# Altium integrated library Connectors.IntLib: 512 symbols (part 1 of 2) (continued)
## B10B-XH-A
designator CON?  (value not drawn)
3 A 250 V 2.5 mm; Value: B10B-XH-A; Pricing Аlternative: 0.029; Note: Connector; Temp.Characteristic: -40C to +85C; ComponentLink1URL: http://www.jst-mfg.com; ComponentLink2URL: http://www.jst-mfg.com/product/images/pdf.gif; Dealer Digi-Key: https://detail.1688.com/offer/38233239228.html; Package / Case: 2.5 mm; PartNumber Digi-Key: B10B-XH-A; Pricing Digi-Key: 0.1; Publisher: Catcatcat Electronics; Voltage: 3 A 250 V 2.5 mm; Website developer: http://catcatcat.d-lan.dp.ua/; Assembly type: Manual Part
footprint B10B-XH-A
pins: 1, 2, 3, 4, 5, 6, 7, 8, 9, 10

## CON4M
designator CON?  (value not drawn)
Note: Connector; Temp.Characteristic: -40C to +85C; Value: *; Publisher: Catcatcat Electronics; Website developer: http://catcatcat.d-lan.dp.ua/; Assembly type: Manual Part
footprint SOED4
pins: 1, 2, 3, 4

## CON6F
designator CON?  (value not drawn)
Note: Connector; Temp.Characteristic: -40C to +85C; Value: *; Publisher: Catcatcat Electronics; Website developer: http://catcatcat.d-lan.dp.ua/; Assembly type: Manual Part
footprint SOED6
pins: 1, 2, 3, 4, 5, 6

## CON6M
designator CON?  (value not drawn)
Note: Connector; Temp.Characteristic: -40C to +85C; Value: *; Publisher: Catcatcat Electronics; Website developer: http://catcatcat.d-lan.dp.ua/; Assembly type: Manual Part
footprint SOED6
pins: 1, 2, 3, 4, 5, 6

## CON8F
designator CON?  (value not drawn)
Note: Connector; Temp.Characteristic: -40C to +85C; Value: *; Publisher: Catcatcat Electronics; Website developer: http://catcatcat.d-lan.dp.ua/; Assembly type: Manual Part
footprint SOED8
pins: 1, 2, 3, 4, 5, 6, 7, 8

## CON8M
designator CON?  (value not drawn)
Note: Connector; Temp.Characteristic: -40C to +85C; Value: *; Publisher: Catcatcat Electronics; Website developer: http://catcatcat.d-lan.dp.ua/; Assembly type: Manual Part
footprint SOED8
pins: 1, 2, 3, 4, 5, 6, 7, 8

## CON10M
designator CON?  (value not drawn)
Note: Connector; Temp.Characteristic: -40C to +85C; Value: *; Publisher: Catcatcat Electronics; Website developer: http://catcatcat.d-lan.dp.ua/; Assembly type: Manual Part
footprint SOED10
pins: 1, 2, 3, 4, 5, 6, 7, 8, 9, 10

## CON18F
designator CON?  (value not drawn)
Note: Connector; Temp.Characteristic: -40C to +85C; Value: *; Publisher: Catcatcat Electronics; Website developer: http://catcatcat.d-lan.dp.ua/; Assembly type: Manual Part
footprint SOED18
pins: 1, 2, 3, 4, 5, 6, 7, 8, 9, 10, 11, 12, 13, 14, 15, 16, 17, 18

## CON18M
designator CON?  (value not drawn)
Note: Connector; Temp.Characteristic: -40C to +85C; Value: *; Publisher: Catcatcat Electronics; Website developer: http://catcatcat.d-lan.dp.ua/; Assembly type: Manual Part
footprint SOED18
pins: 1, 2, 3, 4, 5, 6, 7, 8, 9, 10, 11, 12, 13, 14, 15, 16, 17, 18

## CON20M
designator CON?  (value not drawn)
Note: Connector; Temp.Characteristic: -40C to +85C; Value: *; Publisher: Catcatcat Electronics; Website developer: http://catcatcat.d-lan.dp.ua/; Assembly type: Manual Part
footprint SOED20
pins: 1, 2, 3, 4, 5, 6, 7, 8, 9, 10, 11, 12, 13, 14, 15, 16, 17, 18, 19, 20

## CON-2P-AK-F
designator CA?
Note: Connector; Temp.Characteristic: -40C to +85C; Value: *; Publisher: Catcatcat Electronics; Website developer: http://catcatcat.d-lan.dp.ua/; Assembly type: Manual Part
footprint CON-2P-AK
pins: 1, 2

## CON-2P-AK-M
designator CA?
Note: Connector; Temp.Characteristic: -40C to +85C; Value: *; Publisher: Catcatcat Electronics; Website developer: http://catcatcat.d-lan.dp.ua/; Assembly type: Manual Part
footprint CON-2P-AK
pins: 1, 2

## CON-4PSM
designator CON?
Note: Connector; Temp.Characteristic: -40C to +85C; Value: *; Publisher: Catcatcat Electronics; Website developer: http://catcatcat.d-lan.dp.ua/; Assembly type: Manual Part
footprint CON-4PS
pins: 1, 2, 3, 4

## CON_9P_F
designator CON?
Note: Connector; Temp.Characteristic: -40C to +85C; Value: *; Publisher: Catcatcat Electronics; Website developer: http://catcatcat.d-lan.dp.ua/; Assembly type: Manual Part
footprint DB9RF
pins: 1, 2, 3, 4, 5, 6, 7, 8, 9

## CON_9P_M
designator CON?  (value not drawn)
Note: Connector; Temp.Characteristic: -40C to +85C; Value: *; Publisher: Catcatcat Electronics; Website developer: http://catcatcat.d-lan.dp.ua/; Assembly type: Manual Part
footprint DB9RF
pins: 1, 2, 3, 4, 5, 6, 7, 8, 9

## CON_9P_MP
designator CON?
Note: Connector; Temp.Characteristic: -40C to +85C; Value: *; Publisher: Catcatcat Electronics; Website developer: http://catcatcat.d-lan.dp.ua/; Assembly type: Manual Part
footprint DB9F
pins: 1, 2, 3, 4, 5, 6, 7, 8, 9

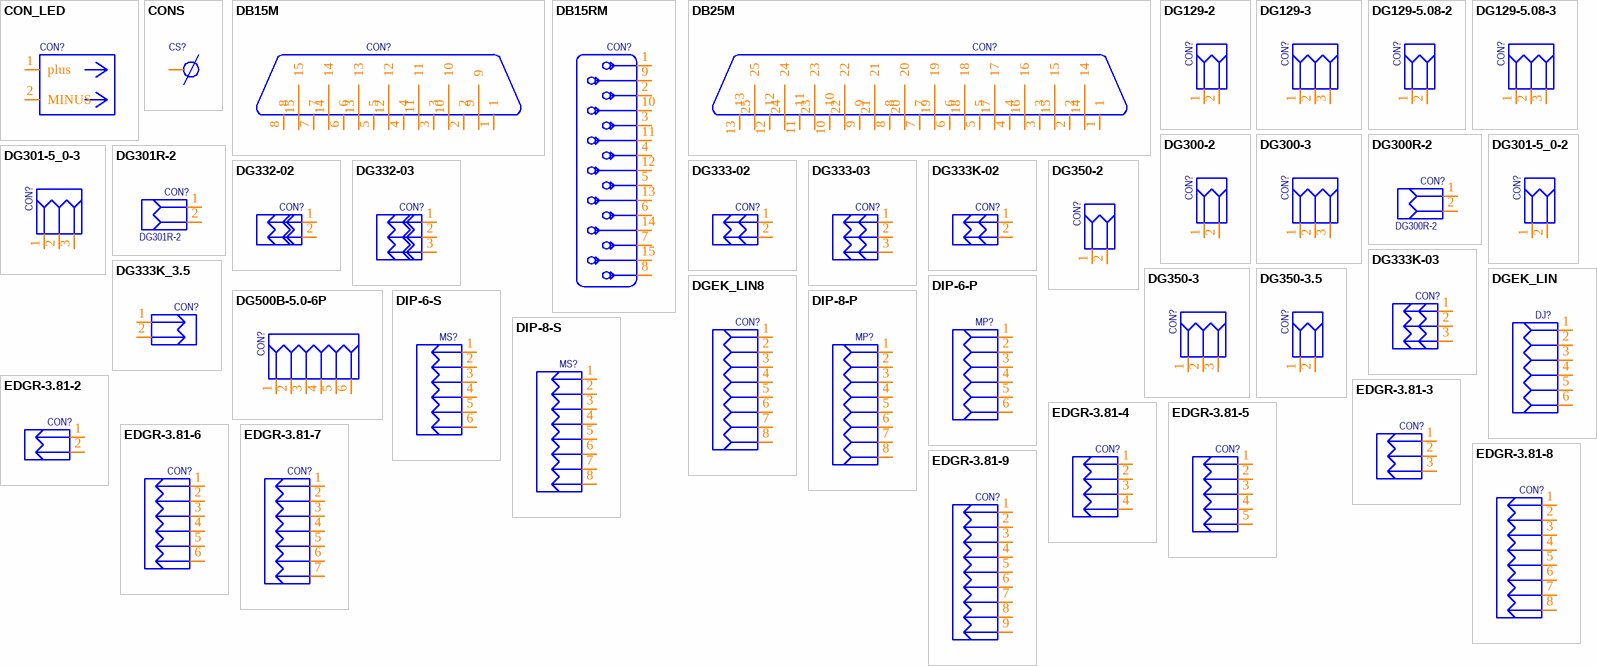
[diagram p2: symbols CON_LED to EDGR-3.81-9]

## CON_LED
designator CON?  (value not drawn)
Note: Connector; Temp.Characteristic: -40C to +85C; Value: *; Publisher: Catcatcat Electronics; Website developer: http://catcatcat.d-lan.dp.ua/; Assembly type: Manual Part
footprint CON_LED
pins: 1 plus, 2 MINUS

## CONS
designator CS?  (value not drawn)
Note: Connector; Temp.Characteristic: -40C to +85C; Value: *; Publisher: Catcatcat Electronics; Website developer: http://catcatcat.d-lan.dp.ua/; Assembly type: Manual Part
footprint CONS
pins: 1

## DB15M
designator CON?  (value not drawn)
Note: Connector; Temp.Characteristic: -40C to +85C; Value: *; Publisher: Catcatcat Electronics; Website developer: http://catcatcat.d-lan.dp.ua/; Assembly type: Manual Part
footprint DB15M
pins: 1, 2, 3, 4, 5, 6, 7, 8, 9, 10, 11, 12, 13, 14, 15

## DB15RM
designator CON?  (value not drawn)
Note: Connector; Temp.Characteristic: -40C to +85C; Value: *; Publisher: Catcatcat Electronics; Website developer: http://catcatcat.d-lan.dp.ua/; Assembly type: Manual Part
footprint DB15RM
pins: 1, 2, 3, 4, 5, 6, 7, 8, 9, 10, 11, 12, 13, 14, 15

## DB25M
designator CON?  (value not drawn)
Note: Connector; Temp.Characteristic: -40C to +85C; Value: *; Publisher: Catcatcat Electronics; Website developer: http://catcatcat.d-lan.dp.ua/; Assembly type: Manual Part
footprint DB25M
pins: 1, 2, 3, 4, 5, 6, 7, 8, 9, 10, 11, 12, 13, 14, 15, 16, 17, 18, 19, 20, 21, 22, 23, 24, 25

## DG129-2
designator CON?  (value not drawn)
Note: Connector; Temp.Characteristic: -40C to +85C; Value: *; Publisher: Catcatcat Electronics; Website developer: http://catcatcat.d-lan.dp.ua/; Assembly type: Manual Part
footprint DG129-2
pins: 1, 2

## DG129-3
designator CON?  (value not drawn)
Note: Connector; Temp.Characteristic: -40C to +85C; Value: *; Publisher: Catcatcat Electronics; Website developer: http://catcatcat.d-lan.dp.ua/; Assembly type: Manual Part
footprint DG129-3
pins: 1, 2, 3

## DG129-5.08-2
designator CON?  (value not drawn)
Note: Connector; Temp.Characteristic: -40C to +85C; Value: *; Publisher: Catcatcat Electronics; Website developer: http://catcatcat.d-lan.dp.ua/; Assembly type: Manual Part
footprint DG129-5.08-2
pins: 1, 2

## DG129-5.08-3
designator CON?  (value not drawn)
Note: Connector; Temp.Characteristic: -40C to +85C; Value: *; Publisher: Catcatcat Electronics; Website developer: http://catcatcat.d-lan.dp.ua/; Assembly type: Manual Part
footprint DG129-5.08-3
pins: 1, 2, 3

## DG300-2
designator CON?  (value not drawn)
Note: Connector; Temp.Characteristic: -40C to +85C; Value: *; Publisher: Catcatcat Electronics; Website developer: http://catcatcat.d-lan.dp.ua/; Assembly type: Manual Part
footprint DG300-2
pins: 1, 2

## DG300-3
designator CON?  (value not drawn)
Note: Connector; Temp.Characteristic: -40C to +85C; Value: *; Publisher: Catcatcat Electronics; Website developer: http://catcatcat.d-lan.dp.ua/; Assembly type: Manual Part
footprint DG300-3
pins: 1, 2, 3

## DG300R-2
designator CON?
Note: Connector; Temp.Characteristic: -40C to +85C; Value: *; Publisher: Catcatcat Electronics; Website developer: http://catcatcat.d-lan.dp.ua/; Assembly type: Manual Part
footprint DG300R-2
pins: 1, 2

## DG301-5_0-2
designator CON?  (value not drawn)
Note: Connector; Temp.Characteristic: -40C to +85C; Value: *; Publisher: Catcatcat Electronics; Website developer: http://catcatcat.d-lan.dp.ua/; Assembly type: Manual Part
footprint DG301-5_0-2
pins: 1, 2

## DG301-5_0-3
designator CON?  (value not drawn)
Note: Connector; Temp.Characteristic: -40C to +85C; Value: *; Publisher: Catcatcat Electronics; Website developer: http://catcatcat.d-lan.dp.ua/; Assembly type: Manual Part
footprint DG301-5_0-3
pins: 1, 2, 3

## DG301R-2
designator CON?
Note: Connector; Temp.Characteristic: -40C to +85C; Value: *; Publisher: Catcatcat Electronics; Website developer: http://catcatcat.d-lan.dp.ua/; Assembly type: Manual Part
footprint DG301R-2
pins: 1, 2

## DG332-02
designator CON?  (value not drawn)
Note: Connector; Temp.Characteristic: -40C to +85C; Value: *; Publisher: Catcatcat Electronics; Website developer: http://catcatcat.d-lan.dp.ua/; Assembly type: Manual Part
footprint DG332-02
pins: 1, 2

## DG332-03
designator CON?  (value not drawn)
Note: Connector; Temp.Characteristic: -40C to +85C; Value: *; Publisher: Catcatcat Electronics; Website developer: http://catcatcat.d-lan.dp.ua/; Assembly type: Manual Part
footprint DG332-03
pins: 1, 2, 3

## DG333-02
designator CON?  (value not drawn)
Note: Connector; Temp.Characteristic: -40C to +85C; Value: *; Publisher: Catcatcat Electronics; Website developer: http://catcatcat.d-lan.dp.ua/; Assembly type: Manual Part
footprint DG333-02
pins: 1, 2

## DG333-03
designator CON?  (value not drawn)
Note: Connector; Temp.Characteristic: -40C to +85C; Value: *; Publisher: Catcatcat Electronics; Website developer: http://catcatcat.d-lan.dp.ua/; Assembly type: Manual Part
footprint DG333-03
pins: 1, 2, 3

## DG333K-02
designator CON?  (value not drawn)
Note: Connector; Temp.Characteristic: -40C to +85C; Value: *; Publisher: Catcatcat Electronics; Website developer: http://catcatcat.d-lan.dp.ua/; Assembly type: Manual Part
footprint DG333K-02
pins: 1, 2

## DG333K-03
designator CON?  (value not drawn)
Note: Connector; Temp.Characteristic: -40C to +85C; Value: *; Publisher: Catcatcat Electronics; Website developer: http://catcatcat.d-lan.dp.ua/; Assembly type: Manual Part
footprint DG333K-03
pins: 1, 2, 3

## DG333K_3.5
designator CON?  (value not drawn)
Note: Connector; Temp.Characteristic: -40C to +85C; Value: *; Publisher: Catcatcat Electronics; Website developer: http://catcatcat.d-lan.dp.ua/; Assembly type: Manual Part
footprint DG333K_3.5
pins: 1, 2

## DG350-2
designator CON?  (value not drawn)
Note: Connector; Temp.Characteristic: -40C to +85C; Value: *; Publisher: Catcatcat Electronics; Website developer: http://catcatcat.d-lan.dp.ua/; Assembly type: Manual Part
footprint DG350-2
pins: 1, 2

## DG350-3
designator CON?  (value not drawn)
Note: Connector; Temp.Characteristic: -40C to +85C; Value: *; Publisher: Catcatcat Electronics; Website developer: http://catcatcat.d-lan.dp.ua/; Assembly type: Manual Part
footprint DG350-3
pins: 1, 2, 3

## DG350-3.5
designator CON?  (value not drawn)
Note: Connector; Temp.Characteristic: -40C to +85C; Value: *; Publisher: Catcatcat Electronics; Website developer: http://catcatcat.d-lan.dp.ua/; Assembly type: Manual Part
footprint DG350-3.5
pins: 1, 2

## DG500B-5.0-6P
designator CON?  (value not drawn)
Note: Connector; Temp.Characteristic: -40C to +85C; Value: *; Publisher: Catcatcat Electronics; Website developer: http://catcatcat.d-lan.dp.ua/; Assembly type: Manual Part
footprint DG500B-5.0-6P
pins: 1, 2, 3, 4, 5, 6

## DGEK_LIN
designator DJ?  (value not drawn)
Note: Connector; Temp.Characteristic: -40C to +85C; Value: *; Publisher: Catcatcat Electronics; Website developer: http://catcatcat.d-lan.dp.ua/; Assembly type: Manual Part
footprint DGEK_LIN
pins: 1, 2, 3, 4, 5, 6

## DGEK_LIN8
designator CON?  (value not drawn)
Note: Connector; Temp.Characteristic: -40C to +85C; Value: *; Publisher: Catcatcat Electronics; Website developer: http://catcatcat.d-lan.dp.ua/; Assembly type: Manual Part
footprint DGEK_LIN8
pins: 1, 2, 3, 4, 5, 6, 7, 8

## DIP-6-P
designator MP?  (value not drawn)
Note: Connector; Temp.Characteristic: -40C to +85C; Value: *; Publisher: Catcatcat Electronics; Website developer: http://catcatcat.d-lan.dp.ua/; Assembly type: Manual Part
footprint DIP-6-P
pins: 1, 2, 3, 4, 5, 6

## DIP-6-S
designator MS?  (value not drawn)
Note: Connector; Temp.Characteristic: -40C to +85C; Value: *; Publisher: Catcatcat Electronics; Website developer: http://catcatcat.d-lan.dp.ua/; Assembly type: Manual Part
footprint DIP-6-S
pins: 1, 2, 3, 4, 5, 6

## DIP-8-P
designator MP?  (value not drawn)
Note: Connector; Temp.Characteristic: -40C to +85C; Value: *; Publisher: Catcatcat Electronics; Website developer: http://catcatcat.d-lan.dp.ua/; Assembly type: Manual Part
footprint DIP-8-P
pins: 1, 2, 3, 4, 5, 6, 7, 8

## DIP-8-S
designator MS?  (value not drawn)
Note: Connector; Temp.Characteristic: -40C to +85C; Value: *; Publisher: Catcatcat Electronics; Website developer: http://catcatcat.d-lan.dp.ua/; Assembly type: Manual Part
footprint DIP-8-S
pins: 1, 2, 3, 4, 5, 6, 7, 8

## EDGR-3.81-2
designator CON?  (value not drawn)
Note: Connector; Temp.Characteristic: -40C to +85C; Value: *; Publisher: Catcatcat Electronics; Website developer: http://catcatcat.d-lan.dp.ua/; Assembly type: Manual Part
footprint EDGR-3.81-2
pins: 1, 2

## EDGR-3.81-3
designator CON?  (value not drawn)
Note: Connector; Temp.Characteristic: -40C to +85C; Value: *; Publisher: Catcatcat Electronics; Website developer: http://catcatcat.d-lan.dp.ua/; Assembly type: Manual Part
footprint EDGR-3.81-3
pins: 1, 2, 3

## EDGR-3.81-4
designator CON?  (value not drawn)
Note: Connector; Temp.Characteristic: -40C to +85C; Value: *; Publisher: Catcatcat Electronics; Website developer: http://catcatcat.d-lan.dp.ua/; Assembly type: Manual Part
footprint EDGR-3.81-4
pins: 1, 2, 3, 4

## EDGR-3.81-5
designator CON?  (value not drawn)
Note: Connector; Temp.Characteristic: -40C to +85C; Value: *; Publisher: Catcatcat Electronics; Website developer: http://catcatcat.d-lan.dp.ua/; Assembly type: Manual Part
footprint EDGR-3.81-5
pins: 1, 2, 3, 4, 5

## EDGR-3.81-6
designator CON?  (value not drawn)
Note: Connector; Temp.Characteristic: -40C to +85C; Value: *; Publisher: Catcatcat Electronics; Website developer: http://catcatcat.d-lan.dp.ua/; Assembly type: Manual Part
footprint EDGR-3.81-6
pins: 1, 2, 3, 4, 5, 6

## EDGR-3.81-7
designator CON?  (value not drawn)
Note: Connector; Temp.Characteristic: -40C to +85C; Value: *; Publisher: Catcatcat Electronics; Website developer: http://catcatcat.d-lan.dp.ua/; Assembly type: Manual Part
footprint EDGR-3.81-7
pins: 1, 2, 3, 4, 5, 6, 7

## EDGR-3.81-8
designator CON?  (value not drawn)
Note: Connector; Temp.Characteristic: -40C to +85C; Value: *; Publisher: Catcatcat Electronics; Website developer: http://catcatcat.d-lan.dp.ua/; Assembly type: Manual Part
footprint EDGR-3.81-8
pins: 1, 2, 3, 4, 5, 6, 7, 8

## EDGR-3.81-9
designator CON?  (value not drawn)
Note: Connector; Temp.Characteristic: -40C to +85C; Value: *; Publisher: Catcatcat Electronics; Website developer: http://catcatcat.d-lan.dp.ua/; Assembly type: Manual Part
footprint EDGR-3.81-9
pins: 1, 2, 3, 4, 5, 6, 7, 8, 9

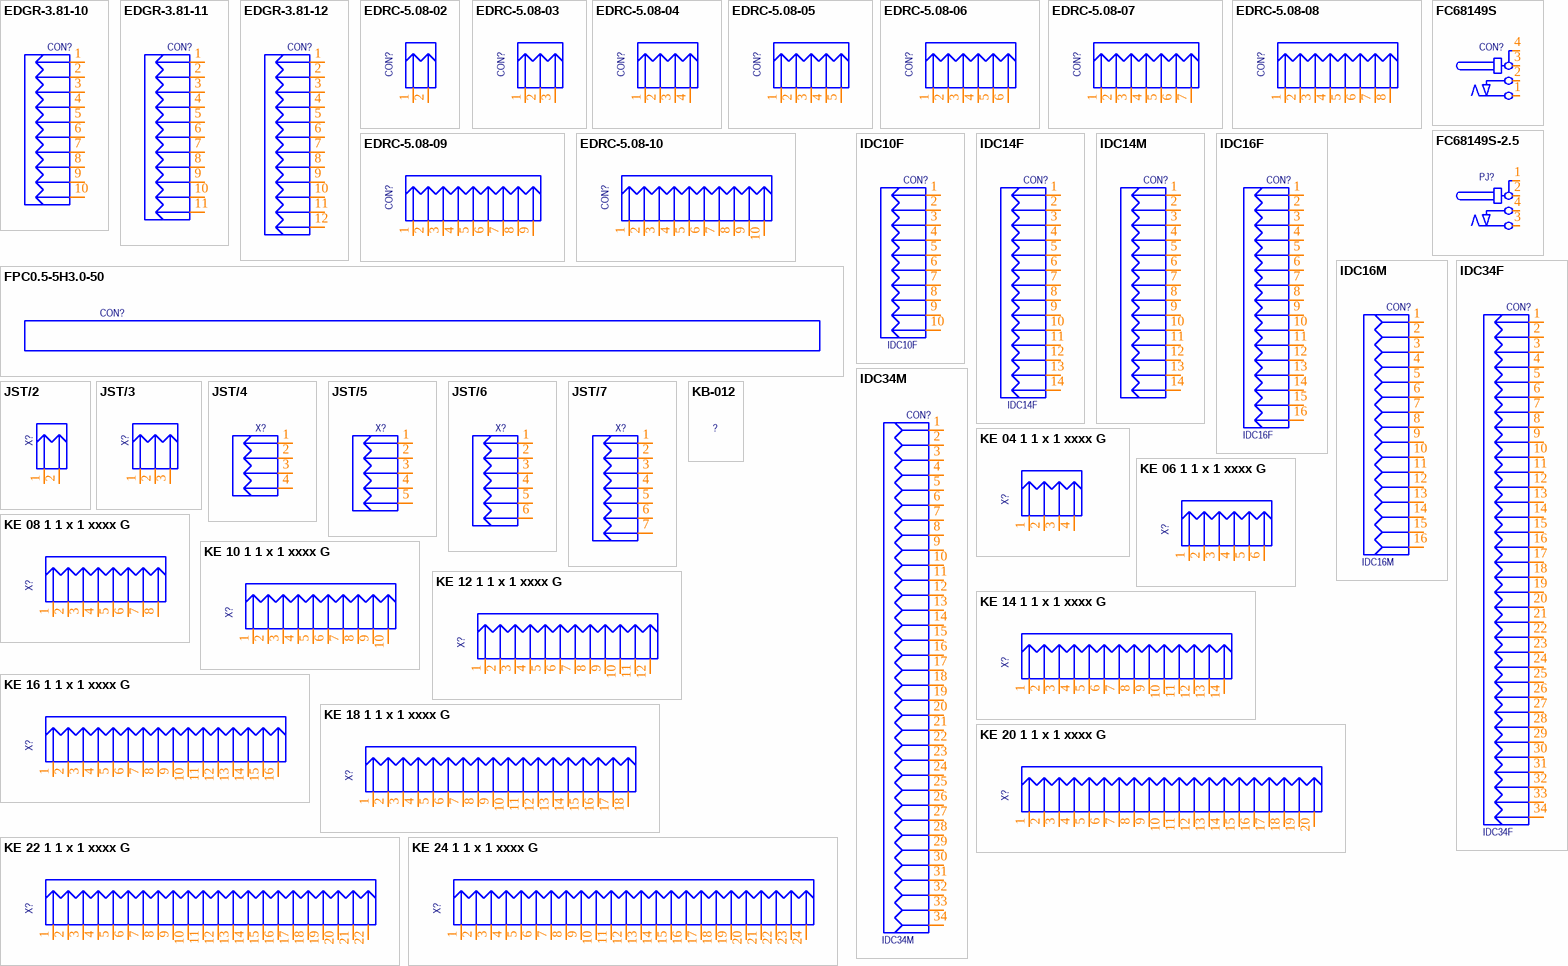
[diagram p3: symbols EDGR-3.81-10 to KE 24 1 1 x 1 xxxx G]

## EDGR-3.81-10
designator CON?  (value not drawn)
Note: Connector; Temp.Characteristic: -40C to +85C; Value: *; Publisher: Catcatcat Electronics; Website developer: http://catcatcat.d-lan.dp.ua/; Assembly type: Manual Part
footprint EDGR-3.81-10
pins: 1, 2, 3, 4, 5, 6, 7, 8, 9, 10

## EDGR-3.81-11
designator CON?  (value not drawn)
Note: Connector; Temp.Characteristic: -40C to +85C; Value: *; Publisher: Catcatcat Electronics; Website developer: http://catcatcat.d-lan.dp.ua/; Assembly type: Manual Part
footprint EDGR-3.81-11
pins: 1, 2, 3, 4, 5, 6, 7, 8, 9, 10, 11

## EDGR-3.81-12
designator CON?  (value not drawn)
Note: Connector; Temp.Characteristic: -40C to +85C; Value: *; Publisher: Catcatcat Electronics; Website developer: http://catcatcat.d-lan.dp.ua/; Assembly type: Manual Part
footprint EDGR-3.81-12
pins: 1, 2, 3, 4, 5, 6, 7, 8, 9, 10, 11, 12

## EDRC-5.08-02
designator CON?  (value not drawn)
Note: Connector; Temp.Characteristic: -40C to +85C; Value: *; Publisher: Catcatcat Electronics; Website developer: http://catcatcat.d-lan.dp.ua/; Assembly type: Manual Part
footprint EDRC-5.08-02
pins: 1, 2

## EDRC-5.08-03
designator CON?  (value not drawn)
Note: Connector; Temp.Characteristic: -40C to +85C; Value: *; Publisher: Catcatcat Electronics; Website developer: http://catcatcat.d-lan.dp.ua/; Assembly type: Manual Part
footprint EDRC-5.08-03
pins: 1, 2, 3

## EDRC-5.08-04
designator CON?  (value not drawn)
Note: Connector; Temp.Characteristic: -40C to +85C; Value: *; Publisher: Catcatcat Electronics; Website developer: http://catcatcat.d-lan.dp.ua/; Assembly type: Manual Part
footprint EDRC-5.08-04
pins: 1, 2, 3, 4

## EDRC-5.08-05
designator CON?  (value not drawn)
Note: Connector; Temp.Characteristic: -40C to +85C; Value: *; Publisher: Catcatcat Electronics; Website developer: http://catcatcat.d-lan.dp.ua/; Assembly type: Manual Part
footprint EDRC-5.08-05
pins: 1, 2, 3, 4, 5

## EDRC-5.08-06
designator CON?  (value not drawn)
Note: Connector; Temp.Characteristic: -40C to +85C; Value: *; Publisher: Catcatcat Electronics; Website developer: http://catcatcat.d-lan.dp.ua/; Assembly type: Manual Part
footprint EDRC-5.08-06
pins: 1, 2, 3, 4, 5, 6

## EDRC-5.08-07
designator CON?  (value not drawn)
Note: Connector; Temp.Characteristic: -40C to +85C; Value: *; Publisher: Catcatcat Electronics; Website developer: http://catcatcat.d-lan.dp.ua/; Assembly type: Manual Part
footprint EDRC-5.08-07
pins: 1, 2, 3, 4, 5, 6, 7

## EDRC-5.08-08
designator CON?  (value not drawn)
Note: Connector; Temp.Characteristic: -40C to +85C; Value: *; Publisher: Catcatcat Electronics; Website developer: http://catcatcat.d-lan.dp.ua/; Assembly type: Manual Part
footprint EDRC-5.08-08
pins: 1, 2, 3, 4, 5, 6, 7, 8

## EDRC-5.08-09
designator CON?  (value not drawn)
Note: Connector; Temp.Characteristic: -40C to +85C; Value: *; Publisher: Catcatcat Electronics; Website developer: http://catcatcat.d-lan.dp.ua/; Assembly type: Manual Part
footprint EDRC-5.08-09
pins: 1, 2, 3, 4, 5, 6, 7, 8, 9

## EDRC-5.08-10
designator CON?  (value not drawn)
Note: Connector; Temp.Characteristic: -40C to +85C; Value: *; Publisher: Catcatcat Electronics; Website developer: http://catcatcat.d-lan.dp.ua/; Assembly type: Manual Part
footprint EDRC-5.08-10
pins: 1, 2, 3, 4, 5, 6, 7, 8, 9, 10

## FC68149S
designator CON?  (value not drawn)
Note: Connector; Temp.Characteristic: -40C to +85C; Value: *; Publisher: Catcatcat Electronics; Website developer: http://catcatcat.d-lan.dp.ua/; Assembly type: Manual Part
footprint FC68149S
pins: 1, 2, 3, 4

## FC68149S-2.5
designator PJ?  (value not drawn)
Note: Connector; Temp.Characteristic: -40C to +85C; Value: *; Publisher: Catcatcat Electronics; Website developer: http://catcatcat.d-lan.dp.ua/; Assembly type: Manual Part
footprint FC68149S-2.5
pins: 1, 2, 3, 4

## FPC0.5-5H3.0-50
designator CON?  (value not drawn)
Note: Connector; Temp.Characteristic: -40C to +85C; Value: *; Publisher: Catcatcat Electronics; Website developer: http://catcatcat.d-lan.dp.ua/; Assembly type: Manual Part
footprint FPC0.5-5H3.0-50
pins: 1 hidden, 2 hidden, 3 hidden, 4 hidden, 5 hidden, 6 hidden, 7 hidden, 8 hidden, 9 hidden, 10 hidden, 11 hidden, 12 hidden, 13 hidden, 14 hidden, 15 hidden, 16 hidden, 17 hidden, 18 hidden, 19 hidden, 20 hidden, 21 hidden, 22 hidden, 23 hidden, 24 hidden, 25 hidden, 26 hidden, 27 hidden, 28 hidden, 29 hidden, 30 hidden, 31 hidden, 32 hidden, 33 hidden, 34 hidden, 35 hidden, 36 hidden, 37 hidden, 38 hidden, 39 hidden, 40 hidden, 41 hidden, 42 hidden, 43 hidden, 44 hidden, 45 hidden, 46 hidden, 47 hidden, 48 hidden, 49 hidden, 50 hidden, 51 hidden, 52 hidden

## IDC10F
designator CON?
Note: Connector; Temp.Characteristic: -40C to +85C; Value: *; Publisher: Catcatcat Electronics; Website developer: http://catcatcat.d-lan.dp.ua/; Assembly type: Manual Part
footprint IDC10F
pins: 1, 2, 3, 4, 5, 6, 7, 8, 9, 10

## IDC14F
designator CON?
Note: Connector; Temp.Characteristic: -40C to +85C; Value: *; Publisher: Catcatcat Electronics; Website developer: http://catcatcat.d-lan.dp.ua/; Assembly type: Manual Part
footprint IDC14F
pins: 1, 2, 3, 4, 5, 6, 7, 8, 9, 10, 11, 12, 13, 14

## IDC14M
designator CON?  (value not drawn)
Note: Connector; Temp.Characteristic: -40C to +85C; Value: *; Publisher: Catcatcat Electronics; Website developer: http://catcatcat.d-lan.dp.ua/; Assembly type: Manual Part
footprint IDC14M
pins: 1, 2, 3, 4, 5, 6, 7, 8, 9, 10, 11, 12, 13, 14

## IDC16F
designator CON?
Note: Connector; Temp.Characteristic: -40C to +85C; Value: *; Publisher: Catcatcat Electronics; Website developer: http://catcatcat.d-lan.dp.ua/; Assembly type: Manual Part
footprint IDC16F
pins: 1, 2, 3, 4, 5, 6, 7, 8, 9, 10, 11, 12, 13, 14, 15, 16

## IDC16M
designator CON?
Note: Connector; Temp.Characteristic: -40C to +85C; Value: *; Publisher: Catcatcat Electronics; Website developer: http://catcatcat.d-lan.dp.ua/; Assembly type: Manual Part
footprint IDC16M
pins: 1, 2, 3, 4, 5, 6, 7, 8, 9, 10, 11, 12, 13, 14, 15, 16

## IDC34F
designator CON?
Note: Connector; Temp.Characteristic: -40C to +85C; Value: *; Publisher: Catcatcat Electronics; Website developer: http://catcatcat.d-lan.dp.ua/; Assembly type: Manual Part
footprint IDC34F
pins: 1, 2, 3, 4, 5, 6, 7, 8, 9, 10, 11, 12, 13, 14, 15, 16, 17, 18, 19, 20, 21, 22, 23, 24, 25, 26, 27, 28, 29, 30, 31, 32, 33, 34

## IDC34M
designator CON?
Note: Connector; Temp.Characteristic: -40C to +85C; Value: *; Publisher: Catcatcat Electronics; Website developer: http://catcatcat.d-lan.dp.ua/; Assembly type: Manual Part
footprint IDC34M
pins: 1, 2, 3, 4, 5, 6, 7, 8, 9, 10, 11, 12, 13, 14, 15, 16, 17, 18, 19, 20, 21, 22, 23, 24, 25, 26, 27, 28, 29, 30, 31, 32, 33, 34

## JST/2
designator X?  (value not drawn)
Note: Connector; Temp.Characteristic: -40C to +85C; Value: *; Publisher: Catcatcat Electronics; Website developer: http://catcatcat.d-lan.dp.ua/; Assembly type: Manual Part
footprint JST/2
pins: 1, 2

## JST/3
designator X?  (value not drawn)
Note: Connector; Temp.Characteristic: -40C to +85C; Value: *; Publisher: Catcatcat Electronics; Website developer: http://catcatcat.d-lan.dp.ua/; Assembly type: Manual Part
footprint JST/3
pins: 1, 2, 3

## JST/4
designator X?  (value not drawn)
Note: Connector; Temp.Characteristic: -40C to +85C; Value: *; Publisher: Catcatcat Electronics; Website developer: http://catcatcat.d-lan.dp.ua/; Assembly type: Manual Part
footprint JST/4
pins: 1, 2, 3, 4

## JST/5
designator X?  (value not drawn)
Note: Connector; Temp.Characteristic: -40C to +85C; Value: *; Publisher: Catcatcat Electronics; Website developer: http://catcatcat.d-lan.dp.ua/; Assembly type: Manual Part
footprint JST/5
pins: 1, 2, 3, 4, 5

## JST/6
designator X?  (value not drawn)
Note: Connector; Temp.Characteristic: -40C to +85C; Value: *; Publisher: Catcatcat Electronics; Website developer: http://catcatcat.d-lan.dp.ua/; Assembly type: Manual Part
footprint JST/6
pins: 1, 2, 3, 4, 5, 6

## JST/7
designator X?  (value not drawn)
Note: Connector; Temp.Characteristic: -40C to +85C; Value: *; Publisher: Catcatcat Electronics; Website developer: http://catcatcat.d-lan.dp.ua/; Assembly type: Manual Part
footprint JST/7
pins: 1, 2, 3, 4, 5, 6, 7

## KB-012
designator ?  (value not drawn)
Note: Connector; Temp.Characteristic: -40C to +85C; Value: *; Publisher: Catcatcat Electronics; Website developer: http://catcatcat.d-lan.dp.ua/; Assembly type: Manual Part
footprint KB-012
pins: 1 hidden, 2 hidden, 3 hidden, 4 hidden, 5 hidden, 6 hidden, 7 hidden, 8 hidden, 9 hidden, 10 hidden, 11 hidden, 12 hidden

## KE 04 1 1 x 1 xxxx G
designator X?  (value not drawn)
3.5 mm 300V/8A; Manufacturer PartNumber: jx-017; Value: WJ15EDGRHBN-THT-3.5; Note: Connector; Temp.Characteristic: -40C to +85C; Package / Case: 3.5 mm; PartNumber Digi-Key: jx-017; Publisher: Catcatcat Electronics; Voltage: 300V/8A; Manufacturer: http://en.china-wj.com/index.html; Website developer: http://catcatcat.d-lan.dp.ua/; Assembly type: Manual Part
footprint KE 04 1 1 x 1 xxxx G
pins: 1, 2, 3, 4